# Altium footprint library OT Library.PcbLib: 396 footprints (part 12 of 25)
Each footprint in its own frame and in the unit in brackets; x right, y up, seen from the top. Pads: shape width x height; smd on the part's side, far side on the other; paste and mask are expansions set on the pad; w line width, h text height; cw(c..) or ccw(c..) is an arc to the next point about the centre after c.
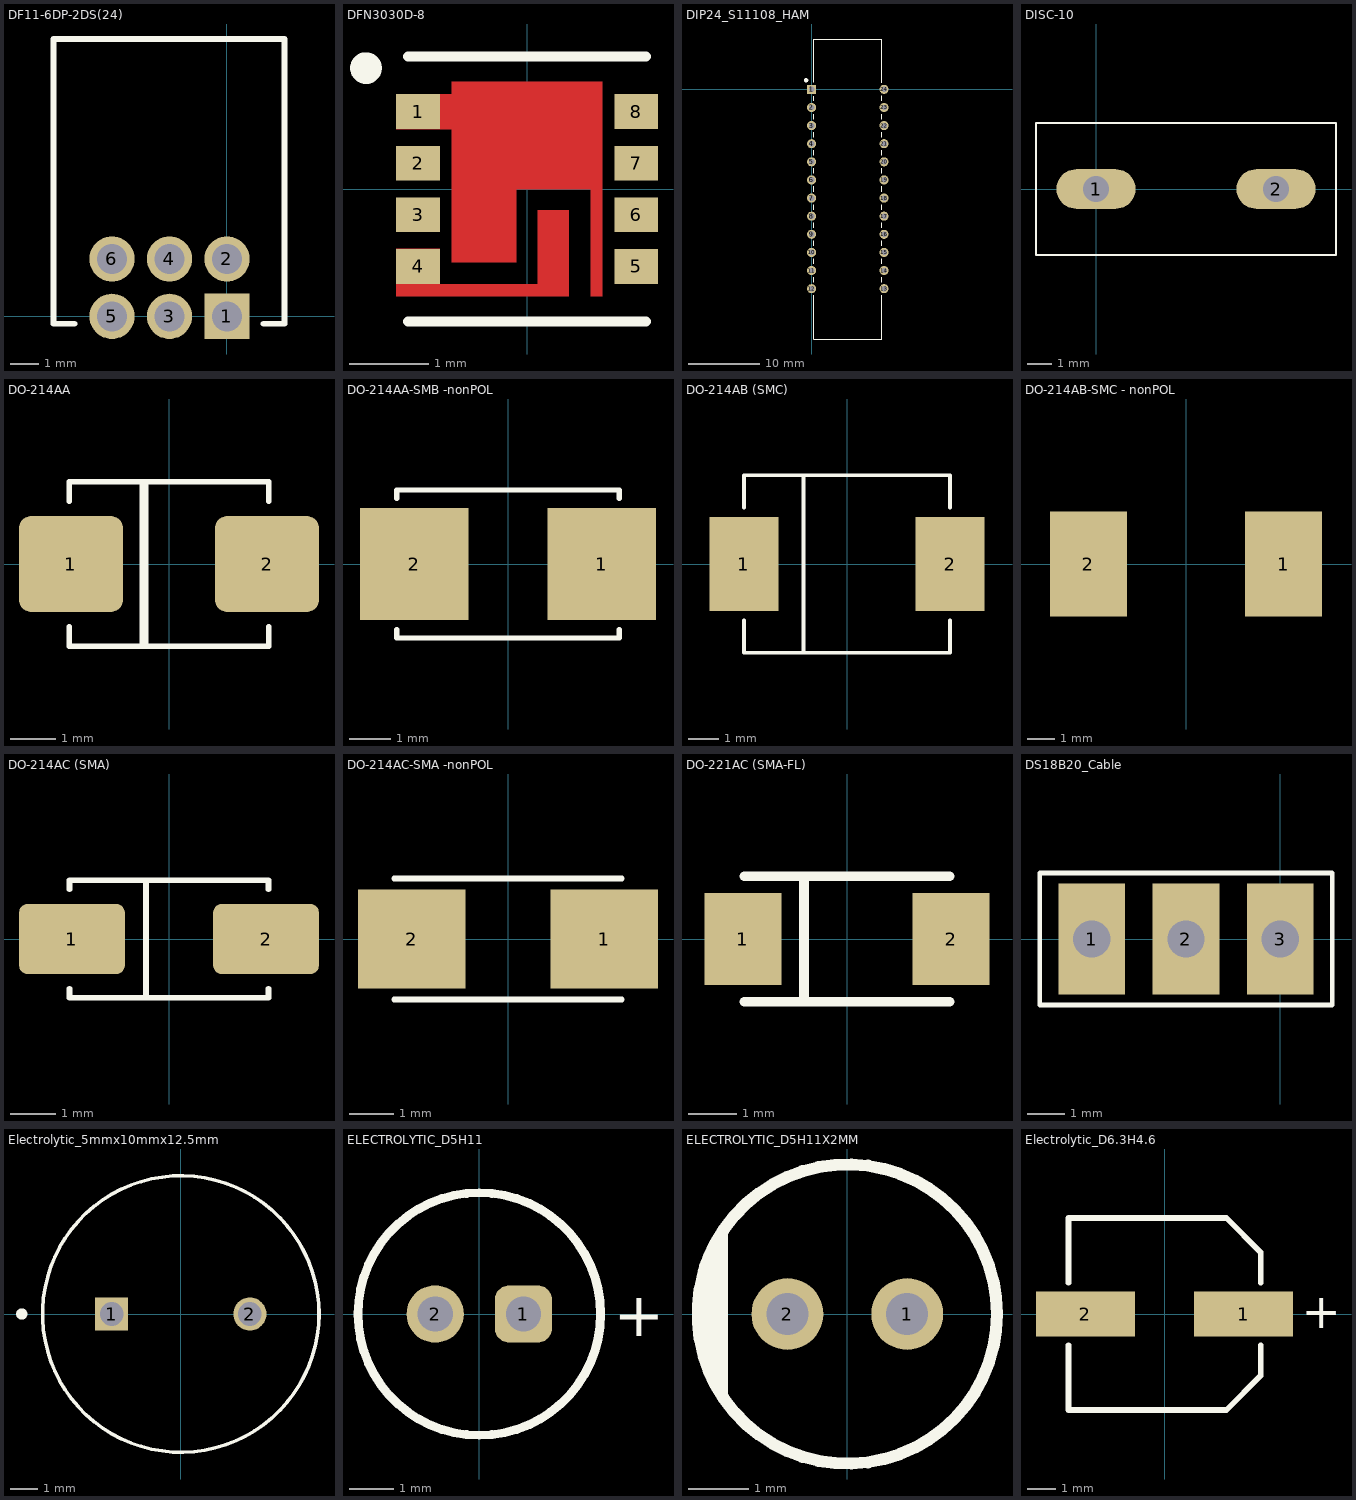
[diagram p11: the footprints below, top view; thin cyan lines are the x and y axes]

## DF11-6DP-2DS(24) [mm]
pads (6):
  rect 1.575x1.575 / inner round 1.575 / far side rect 1.575x1.575 hole 1.05: 1(0,0)
  round 1.575 hole 1.05: 2(0,2) 3(-2,0) 4(-2,2) 5(-4,0) 6(-4,2)
Top Overlay:
  lines w0.2: -5.302,-0.254 -6.032,-0.254 -6.032,9.652 2,9.652 2,-0.254 1.27,-0.254
3D body: height 5.16, standoff -2.84, extent -6.032,-0.254 1.968,9.746

## DFN3030D-8 [mm]
height 0.63
pads (8):
  rect 0.55x0.44 smd paste-1 mask+0: 1(-1.375,0.975) 4(-1.375,-0.975)
  rect 0.55x0.44 smd mask+0.05: 2(-1.375,0.325) 3(-1.375,-0.325) 5(1.375,-0.975) 6(1.375,-0.325) 7(1.375,0.325) 8(1.375,0.975)
Top Layer:
  region: 0.525,-1.35 -1.65,-1.35 -1.65,-0.755 -1.1,-0.755 -1.1,-1.2 0.135,-1.2 0.135,-0.27 0.525,-0.27
  region: 0.95,-1.35 0.8,-1.35 0.8,0 -0.135,0 -0.135,-0.925 -0.95,-0.925 -0.95,0.755 -1.65,0.755 -1.65,1.195 -0.95,1.195 -0.95,1.35 0.95,1.35
Top Overlay:
  circle w0.2: c-2.032,1.524 r0.1
  lines w0.127: -1.5,-1.67 1.5,-1.67 ; -1.5,1.67 1.5,1.67
Top Paste:
  region: 0.525,-1.35 -1.65,-1.35 -1.65,-0.755 -1.1,-0.755 -1.1,-1.2 0.135,-1.2 0.135,-0.27 0.525,-0.27
  region: 0.95,-1.35 0.8,-1.35 0.8,0 -0.135,0 -0.135,-0.925 -0.95,-0.925 -0.95,0.755 -1.65,0.755 -1.65,1.195 -0.95,1.195 -0.95,1.35 0.95,1.35
Top Solder:
  region: 0.575,-1.4 -1.7,-1.4 -1.7,-0.705 -1.05,-0.705 -1.05,-1.15 0.085,-1.15 0.085,-0.22 0.575,-0.22
  region: 1,-1.4 0.75,-1.4 0.75,-0.05 -0.085,-0.05 -0.085,-0.975 -1,-0.975 -1,0.705 -1.7,0.705 -1.7,1.245 -1,1.245 -1,1.4 1,1.4
3D body: height 0.6, standoff 0, extent -1.496,-1.524 1.524,1.496

## DIP24_S11108_HAM [mil]
pads (24):
  rect 50x50 / inner round 60 / far side rect 50x50 hole 30 paste-25 mask+0: 1(0,0)
  round 50 / inner round 60 / far side round 50 hole 30 paste-25 mask+0: 2(0,-100) 3(0,-200) 4(0,-300) 5(0,-400) 6(0,-500) 7(0,-600) 8(0,-700) 9(0,-800) 10(0,-900) 11(0,-1000) 12(0,-1100) 13(400,-1100) 14(400,-1000) 15(400,-900) 16(400,-800) 17(400,-700) 18(400,-600) 19(400,-500) 20(400,-400) 21(400,-300) 22(400,-200) 23(400,-100) 24(400,0)
Top Overlay:
  circle w15.75: c-30,50 r3.94
  lines w6: 12,-1136.16 12,-1378 388,-1378 388,-1136.16 ; 12,-1063.84 12,-1036.16 ; 12,-963.84 12,-936.16 ; 12,-863.84 12,-836.16 ; 12,-763.84 12,-736.16 ; 12,-663.84 12,-636.16 ; 12,-563.84 12,-536.16 ; 12,-463.84 12,-436.16 ; 12,-363.84 12,-336.16 ; 12,-263.84 12,-236.16 ; 12,-163.84 12,-136.16 ; 12,-63.84 12,-38.1 ; 12,38.1 12,278 388,278 388,36.16 ; 388,-1063.84 388,-1036.16 ; 388,-963.84 388,-936.16 ; 388,-863.84 388,-836.16 ; 388,-763.84 388,-736.16 ; 388,-663.84 388,-636.16 ; 388,-563.84 388,-536.16 ; 388,-463.84 388,-436.16 ; 388,-363.84 388,-336.16 ; 388,-263.84 388,-236.16 ; 388,-163.84 388,-136.16 ; 388,-63.84 388,-36.16
3D body: height 123.11, standoff -100, extent -5,-1372.99 415,272.99

## DISC-10 [mm] "Disc 10mm"
pads (2):
  oval 3.3x1.65 hole 1.1: 1(0,0) 2(7.5,0)
Top Overlay:
  lines w0.1: -2.5,-2.75 -2.5,2.75 10,2.75 10,-2.75 -2.5,-2.75
3D body: height 15.5, standoff -17, extent -2.5,-2 10,2

## DO-214AA [mm] "SMBJ"
height 2.65
pads (2):
  rrect25% 2.29x2.12 smd: 1(-2.16,0) 2(2.16,0)
Top Overlay:
  lines w0.127: -2.2,-1.38 -2.2,-1.813 2.2,-1.813 2.2,-1.38 ; -2.2,1.38 -2.2,1.813 2.2,1.813 2.2,1.38
  lines w0.2: -0.549,-1.778 -0.549,1.762
3D body: height 2.65, standoff 0, extent -2.67,-1.813 2.67,1.813

## DO-214AA-SMB -nonPOL [mm]
height 2.642
pads (2):
  rect 2.6x2.7 smd: 1(2.25,0) 2(-2.25,0)
Top Overlay:
  lines w0.127: -2.667,-1.575 -2.667,-1.778 2.667,-1.778 2.667,-1.575 ; -2.667,1.575 -2.667,1.778 2.667,1.778 2.667,1.575
3D body: height 2.35, standoff 0.05, extent -2.7,-1.8 2.7,1.8

## DO-214AB (SMC) [mm]
height 2.62
pads (2):
  rect 2.29x3.12 smd: 1(-3.43,0) 2(3.43,0)
Top Overlay:
  lines w0.127: -3.427,-1.88 -3.427,-2.953 3.427,-2.953 3.427,-1.88 ; -3.427,1.88 -3.427,2.953 3.427,2.953 3.427,1.88 ; -1.448,-2.946 -1.448,2.921
3D body: height 1.21, standoff -1.41, extent -3.969,-2.953 3.969,2.953

## DO-214AB-SMC - nonPOL [mm]
height 2.642
pads (2):
  rect 2.8x3.8 smd: 1(3.55,0) 2(-3.55,0)
3D body: height 2.35, standoff 0.05, extent -3.975,-2.95 3.975,2.95

## DO-214AC (SMA) [mm]
height 2.7
pads (2):
  rrect25% 2.33x1.55 smd: 1(-2.135,0) 2(2.135,0)
Top Overlay:
  lines w0.127: -2.187,-1.095 -2.187,-1.292 2.187,-1.292 2.187,-1.095 ; -2.187,1.095 -2.187,1.292 2.187,1.292 2.187,1.095 ; -0.508,-1.27 -0.508,1.27
3D body: height 2.44, standoff 0, extent -2.598,-1.292 2.598,1.292

## DO-214AC-SMA -nonPOL [mm]
height 4
pads (2):
  rect 2.4x2.2 smd: 1(2.15,0) 2(-2.15,0)
Top Overlay:
  lines w0.127: -2.54,-1.35 2.54,-1.35 ; -2.54,1.35 2.54,1.35
3D body: height 2.36, standoff 2.34, extent -2.01,-1.16 2.01,1.16
3D body: height 2.35, standoff -0.05, extent -2.6,-1.3 2.6,1.3

## DO-221AC (SMA-FL) [mm] "Micro Commercial Co"
height 1
pads (2):
  rect 1.6x1.9 smd: 1(-2.15,0) 2(2.15,0)
Top Overlay:
  lines w0.2: -2.125,-1.3 2.125,-1.3 ; -2.125,1.3 2.125,1.3 ; -0.889,-1.3 -0.889,1.3
3D body: height 1, standoff 0, extent -2.6,-1.3 2.6,1.299

## DS18B20_Cable [mm] "2.54mm"
pads (3):
  rect 1.8x3 hole 1: 1(-5.08,0) 2(-2.54,0) 3(0,0)
Top Overlay:
  lines w0.127: -6.477,-1.778 1.397,-1.778 1.397,1.778 -6.477,1.778 -6.477,-1.778

## Electrolytic_5mmx10mmx12.5mm [mm]
height 12.5
pads (2):
  rect 1.2x1.2 hole 0.85: 1(-2.5,0)
  round 1.2 hole 0.85: 2(2.5,0)
Top Overlay:
  circle w0.2: c-5.75,0 r0.1
  circle w0.127: c0,0 r5
3D body: height 12.5, standoff -17, extent -5,-4.998 5,4.998

## ELECTROLYTIC_D5H11 [mm] "Aluminum Electrolytic Capacitors, 5x11mm"
height 11
pads (2):
  rrect50% 1.3x1.3 hole 0.8: 1(1,0)
  round 1.3 hole 0.8: 2(-1,0)
Top Overlay:
  circle w0.2: c0,0 r2.75
  text "+" at 3.05,-0.5 h1
3D body: height 11.31, standoff -19.91, extent -2.49,-2.5 2.5,2.5

## ELECTROLYTIC_D5H11X2MM [mm]
pads (2):
  round 1.2 hole 0.7: 1(1,0) 2(-1,0)
Top Overlay:
  circle w0.2: c0,0 r2.5
  region: -2,1.5 -2,-1.5 -2.25,-1.25 -2.255,-1.005 -2.392,-0.827 -2.478,-0.619 -2.507,-0.396 -2.5,-0.396 -2.51,0.5 -2.469,0.815 -2.347,1.109 -2.154,1.361 -2.146,1.354
3D body: height 12.7, standoff -3.8, extent -2.75,-2.75 2.75,2.75

## Electrolytic_D6.3H4.6 [mm] "Aluminium Electrolytic V-Chip SMT Capacitors, 6.3x4.6mm"
height 4.6
pads (2):
  rect 3.5x1.6 smd: 1(2.8,0) 2(-2.8,0)
Top Overlay:
  lines w0.2: -3.4,-1.1 -3.4,-3.4 2.188,-3.4 3.4,-2.188 3.4,-1.1 ; -3.4,1.1 -3.4,3.4 2.188,3.4 3.4,2.188 3.4,1.1
  text "+" at 4.85,-0.5 h1.22
3D body: height 4.8, standoff 0.15, extent -3.696,-3.302 3.696,3.302